# Altium footprint library Connectors.PcbLib: 158 footprints (part 10 of 10)
Each footprint in its own frame and in the unit in brackets; x right, y up, seen from the top. Pads: shape width x height; smd on the part's side, far side on the other; paste and mask are expansions set on the pad; w line width, h text height; cw(c..) or ccw(c..) is an arc to the next point about the centre after c.
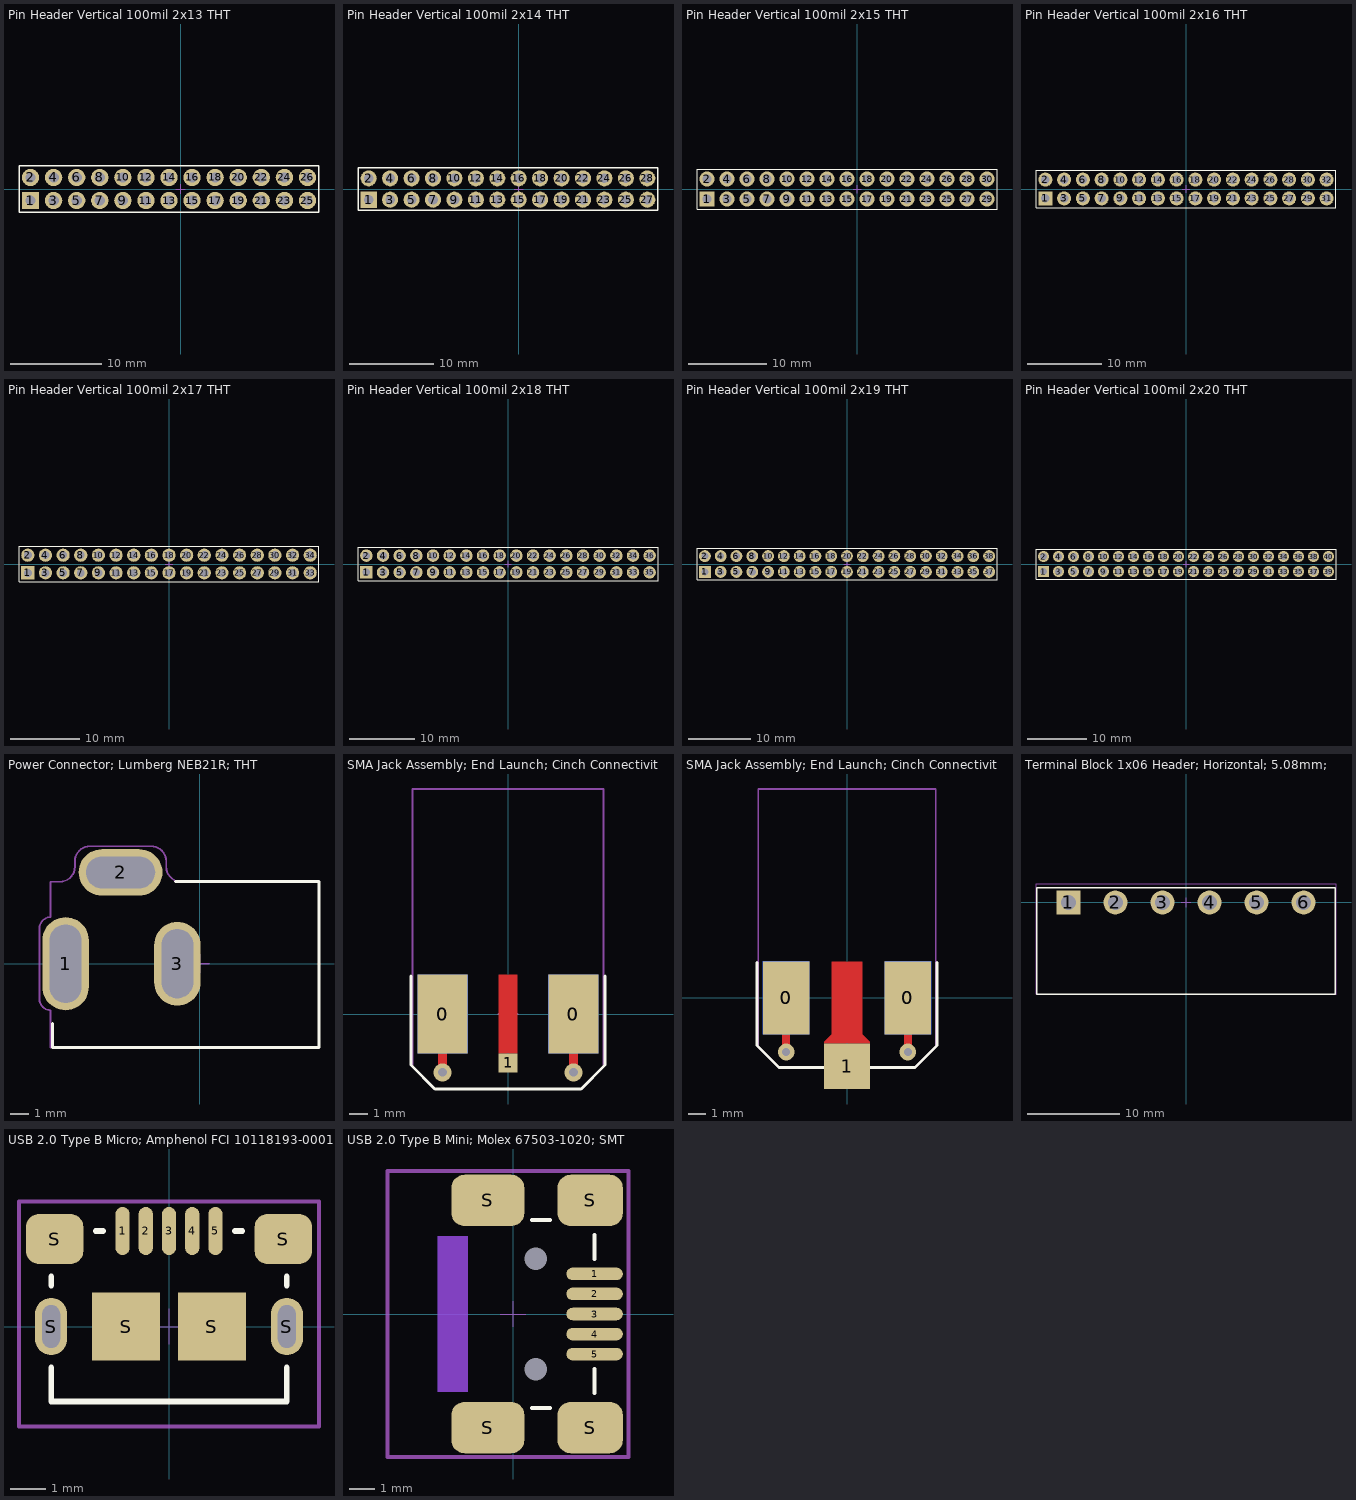
[diagram p9: the footprints below, top view; thin cyan lines are the x and y axes]

## Pin Header Vertical 100mil 2x13 THT [mil]
pads (26):
  rect 75x75 hole 45: 1(-650,-50)
  round 75 hole 45: 2(-650,50) 3(-550,-50) 4(-550,50) 5(-450,-50) 6(-450,50) 7(-350,-50) 8(-350,50) 9(-250,-50) 10(-250,50) 11(-150,-50) 12(-150,50) 13(-50,-50) 14(-50,50) 15(50,-50) 16(50,50) 17(150,-50) 18(150,50) 19(250,-50) 20(250,50) 21(350,-50) 22(350,50) 23(450,-50) 24(450,50) 25(550,-50) 26(550,50)
Top Overlay:
  lines w6: -700,-100 600,-100 600,100 -700,100 -700,-100
Mechanical 15:
  lines w4: -20,0 20,0 ; 0,-20 0,20
3D body "pin_header_vertical_100mil_2x13_THT.stp": height 337.22, standoff -117.11, extent -699.99,-99.99 600.01,100.01

## Pin Header Vertical 100mil 2x14 THT [mil]
pads (28):
  rect 75x75 hole 45: 1(-700,-50)
  round 75 hole 45: 2(-700,50) 3(-600,-50) 4(-600,50) 5(-500,-50) 6(-500,50) 7(-400,-50) 8(-400,50) 9(-300,-50) 10(-300,50) 11(-200,-50) 12(-200,50) 13(-100,-50) 14(-100,50) 15(0,-50) 16(0,50) 17(100,-50) 18(100,50) 19(200,-50) 20(200,50) 21(300,-50) 22(300,50) 23(400,-50) 24(400,50) 25(500,-50) 26(500,50) 27(600,-50) 28(600,50)
Top Overlay:
  lines w6: -750,-100 -750,100 650,100 650,-100 -750,-100
Mechanical 15:
  lines w4: -20,0 20,0 ; 0,-20 0,20
3D body "pin_header_vertical_100mil_2x14_THT.stp": height 337.22, standoff -117.11, extent -749.99,-99.99 650.01,100.01

## Pin Header Vertical 100mil 2x15 THT [mil]
pads (30):
  rect 75x75 hole 45: 1(-750,-50)
  round 75 hole 45: 2(-750,50) 3(-650,-50) 4(-650,50) 5(-550,-50) 6(-550,50) 7(-450,-50) 8(-450,50) 9(-350,-50) 10(-350,50) 11(-250,-50) 12(-250,50) 13(-150,-50) 14(-150,50) 15(-50,-50) 16(-50,50) 17(50,-50) 18(50,50) 19(150,-50) 20(150,50) 21(250,-50) 22(250,50) 23(350,-50) 24(350,50) 25(450,-50) 26(450,50) 27(550,-50) 28(550,50) 29(650,-50) 30(650,50)
Top Overlay:
  lines w6: -800,-100 -800,100 700,100 700,-100 -800,-100
Mechanical 15:
  lines w4: -20,0 20,0 ; 0,-20 0,20
3D body "pin_header_vertical_100mil_2x15_THT.stp": height 337.22, standoff -117.11, extent -799.99,-99.99 700.01,100.01

## Pin Header Vertical 100mil 2x16 THT [mil]
pads (32):
  rect 75x75 hole 45: 1(-750,-50)
  round 75 hole 45: 2(-750,50) 3(-650,-50) 4(-650,50) 5(-550,-50) 6(-550,50) 7(-450,-50) 8(-450,50) 9(-350,-50) 10(-350,50) 11(-250,-50) 12(-250,50) 13(-150,-50) 14(-150,50) 15(-50,-50) 16(-50,50) 17(50,-50) 18(50,50) 19(150,-50) 20(150,50) 21(250,-50) 22(250,50) 23(350,-50) 24(350,50) 25(450,-50) 26(450,50) 27(550,-50) 28(550,50) 29(650,-50) 30(650,50) 31(750,-50) 32(750,50)
Top Overlay:
  lines w6: -800,-100 -800,100 800,100 800,-100 -800,-100
Mechanical 15:
  lines w4: -20,0 20,0 ; 0,-20 0,20
3D body "pin_header_vertical_100mil_2x16_THT.stp": height 337.22, standoff -117.11, extent -799.99,-99.99 800.01,100.01

## Pin Header Vertical 100mil 2x17 THT [mil]
pads (34):
  rect 75x75 hole 45: 1(-800,-50)
  round 75 hole 45: 2(-800,50) 3(-700,-50) 4(-700,50) 5(-600,-50) 6(-600,50) 7(-500,-50) 8(-500,50) 9(-400,-50) 10(-400,50) 11(-300,-50) 12(-300,50) 13(-200,-50) 14(-200,50) 15(-100,-50) 16(-100,50) 17(0,-50) 18(0,50) 19(100,-50) 20(100,50) 21(200,-50) 22(200,50) 23(300,-50) 24(300,50) 25(400,-50) 26(400,50) 27(500,-50) 28(500,50) 29(600,-50) 30(600,50) 31(700,-50) 32(700,50) 33(800,-50) 34(800,50)
Top Overlay:
  lines w6: -850,-100 -850,100 850,100 850,-100 -850,-100
Mechanical 15:
  lines w4: -20,0 20,0 ; 0,-20 0,20
3D body "pin_header_vertical_100mil_2x17_THT.stp": height 337.22, standoff -117.11, extent -849.99,-99.99 850.01,100.01

## Pin Header Vertical 100mil 2x18 THT [mil]
pads (36):
  rect 75x75 hole 45: 1(-850,-50)
  round 75 hole 45: 2(-850,50) 3(-750,-50) 4(-750,50) 5(-650,-50) 6(-650,50) 7(-550,-50) 8(-550,50) 9(-450,-50) 10(-450,50) 11(-350,-50) 12(-350,50) 13(-250,-50) 14(-250,50) 15(-150,-50) 16(-150,50) 17(-50,-50) 18(-50,50) 19(50,-50) 20(50,50) 21(150,-50) 22(150,50) 23(250,-50) 24(250,50) 25(350,-50) 26(350,50) 27(450,-50) 28(450,50) 29(550,-50) 30(550,50) 31(650,-50) 32(650,50) 33(750,-50) 34(750,50) 35(850,-50) 36(850,50)
Top Overlay:
  lines w6: -900,-100 900,-100 900,100 -900,100 -900,-100
Mechanical 15:
  lines w4: -20,0 20,0 ; 0,-20 0,20
3D body "pin_header_vertical_100mil_2x18_THT.stp": height 337.22, standoff -117.11, extent -899.99,-99.99 900.01,100.01

## Pin Header Vertical 100mil 2x19 THT [mil]
pads (38):
  rect 75x75 hole 45: 1(-900,-50)
  round 75 hole 45: 2(-900,50) 3(-800,-50) 4(-800,50) 5(-700,-50) 6(-700,50) 7(-600,-50) 8(-600,50) 9(-500,-50) 10(-500,50) 11(-400,-50) 12(-400,50) 13(-300,-50) 14(-300,50) 15(-200,-50) 16(-200,50) 17(-100,-50) 18(-100,50) 19(0,-50) 20(0,50) 21(100,-50) 22(100,50) 23(200,-50) 24(200,50) 25(300,-50) 26(300,50) 27(400,-50) 28(400,50) 29(500,-50) 30(500,50) 31(600,-50) 32(600,50) 33(700,-50) 34(700,50) 35(800,-50) 36(800,50) 37(900,-50) 38(900,50)
Top Overlay:
  lines w6: -950,-100 950,-100 950,100 -950,100 -950,-100
Mechanical 15:
  lines w4: -20,0 20,0 ; 0,-20 0,20
3D body "pin_header_vertical_100mil_2x17_THT.stp": height 337.22, standoff -117.11, extent -949.99,-99.99 750.01,100.01
3D body "pin_header_vertical_100mil_2x2_THT.stp": height 337.22, standoff -117.11, extent 750.01,-99.99 950.01,100.01

## Pin Header Vertical 100mil 2x20 THT [mil]
pads (40):
  rect 75x75 hole 45: 1(-950,-50)
  round 75 hole 45: 2(-950,50) 3(-850,-50) 4(-850,50) 5(-750,-50) 6(-750,50) 7(-650,-50) 8(-650,50) 9(-550,-50) 10(-550,50) 11(-450,-50) 12(-450,50) 13(-350,-50) 14(-350,50) 15(-250,-50) 16(-250,50) 17(-150,-50) 18(-150,50) 19(-50,-50) 20(-50,50) 21(50,-50) 22(50,50) 23(150,-50) 24(150,50) 25(250,-50) 26(250,50) 27(350,-50) 28(350,50) 29(450,-50) 30(450,50) 31(550,-50) 32(550,50) 33(650,-50) 34(650,50) 35(750,-50) 36(750,50) 37(850,-50) 38(850,50) 39(950,-50) 40(950,50)
Top Overlay:
  lines w6: -1000,-100 1000,-100 1000,100 -1000,100 -1000,-100
Mechanical 15:
  lines w4: -20,0 20,0 ; 0,-20 0,20
3D body "pin_header_vertical_100mil_2x20_THT.stp": height 337.22, standoff -117.11, extent -999.99,-99.99 1000.01,100.01

## Power Connector; Lumberg NEB21R; THT [mm]
pads (3):
  oval 2.5x5 hole 1.7 slot 4.2 at 90 deg: 1(-7.2,0)
  oval 4.5x2.5 hole 1.7 slot 3.7 at 0 deg: 2(-4.25,4.9)
  oval 2.5x4.5 hole 1.7 slot 3.7 at 90 deg: 3(-1.2,0)
Top Overlay:
  lines w0.16: -7.9,-3.2 -7.9,-4.5 6.4,-4.5 6.4,4.4 -1.3,4.4
Mechanical 11:
  lines w0.1: -8.6,-1.9 ccw(c-8,-1.9) -8,-2.5 -8,-4.5 6.4,-4.5 6.4,4.4 -1,4.4 cw(c-1,5.2) -1.8,5.2 -1.8,5.5 ccw(c-2.6,5.5) -2.6,6.3 -5.9,6.3 ccw(c-5.9,5.5) -6.7,5.5 -6.7,5.2 cw(c-7.5,5.2) -7.5,4.4 -8,4.4 -8,2.5 ccw(c-8,1.9) -8.6,1.9 -8.6,-1.9
Mechanical 15:
  lines w0.1: -0.5,0 0.5,0 ; 0,-0.5 0,0.5
3D body "Lumberg - Power Socket 2.1mm 3A; NEB21R.step": height 11.05, standoff -3.45, extent -8,-4.55 6.5,5.15

## SMA Jack Assembly; End Launch; Cinch Connectivity 142-0711-821; 40mil Signal [mil] "Board thickness 1.55mm, 40mil signal trace"
pads (5):
  rect 105x165 smd: 0(-137.5,0) 0(137.5,0)
  rect 105x165 smd far side: 0(-137.5,0) 0(137.5,0)
  rect 40x40 smd paste-20: 1(0,-102.5)
via 137.5,-122.5 diameter 38 hole 18
via -137.5,-122.5 diameter 38 hole 18
Top Layer:
  rectangle: -20,-82.5 20,82.5
  lines w18: -137.5,-122.5 -137.5,0 ; 137.5,-122.5 137.5,0
Bottom Layer:
  lines w18: -137.5,-122.5 -137.5,0 ; 137.5,-122.5 137.5,0
Top Overlay:
  lines w6.3: -203.74,80 -203.74,-107.28 -153.54,-157.48 153.54,-157.48 203.74,-107.28 203.74,80
Mechanical 15:
  lines w3.94: -19.69,0 19.68,0 ; 0,-19.68 0,19.68 ; -200.79,-110.24 -200.79,472.44 200.79,472.44 200.79,-110.24 153.54,-157.48 -153.54,-157.48 -200.79,-110.24
3D body "SMA Jack Assembly End Launch 50R; 142-0701-851.step": height 161.81, standoff -150, extent -186.91,-79 187.9,465.48

## SMA Jack Assembly; End Launch; Cinch Connectivity 142-0711-821; 103mil Signal [mil] "Board thickness 1.55mm, 103mil signal trace"
pads (5):
  rect 105x165 smd: 0(-137.5,0) 0(137.5,0)
  rect 105x165 smd far side: 0(-137.5,0) 0(137.5,0)
  rect 103x103 smd paste-51.5: 1(0,-154.44)
via 137.5,-122.5 diameter 38 hole 18
via -137.5,-122.5 diameter 38 hole 18
Top Layer:
  rectangle: -35,-82.5 35,82.5
  region: 35,-82.5 51.5,-99 51.5,-103 -51.5,-103 -51.5,-99 -35,-82.5
  lines w18: -137.5,-122.5 -137.5,0 ; 137.5,-122.5 137.5,0
Bottom Layer:
  lines w18: -137.5,-122.5 -137.5,0 ; 137.5,-122.5 137.5,0
Top Overlay:
  lines w6.3: -203.74,80 -203.74,-107.28 -153.54,-157.48 153.54,-157.48 203.74,-107.28 203.74,80
Mechanical 15:
  lines w3.94: -19.69,0 19.68,0 ; 0,-19.68 0,19.68 ; -200.79,-110.24 -200.79,472.44 200.79,472.44 200.79,-110.24 153.54,-157.48 -153.54,-157.48 -200.79,-110.24
3D body "SMA Jack Assembly End Launch 50R; 142-0701-851.step": height 161.81, standoff -150, extent -186.91,-79 187.9,465.48

## Terminal Block 1x06 Header; Horizontal; 5.08mm; Amphenol FCI 20020110-H061A01LF; THT [mm]
pads (6):
  rect 2.6x2.6 hole 1.6: 1(-12.7,0)
  round 2.6 hole 1.6: 2(-7.62,0) 3(-2.54,0) 4(2.54,0) 5(7.62,0) 6(12.7,0)
Top Overlay:
  lines w0.16: -16.1,-9.9 16.1,-9.9 16.1,1.6 -16.1,1.6 -16.1,-9.9
Mechanical 11:
  lines w0.1: -16.2,-9.9 -16.2,2 16.2,2 16.2,-9.9 -16.2,-9.9
Mechanical 15:
  lines w0.1: -0.5,0 0.5,0 ; 0,-0.5 0,0.5
3D body "Terminal Block 1x06 Header; Horizontal; 5.08mm; Amphenol FCI 20020110-H061A01LF; THT.stp": height 8.55, standoff -3.45, extent -16.24,-9.988 16.24,2.012

## USB 2.0 Type B Micro; Amphenol FCI 10118193-0001LF; SMT [mm]
pads (11):
  oval 0.4x1.35 smd: 1(-1.3,2.675) 2(-0.65,2.675) 3(0,2.675) 4(0.65,2.675) 5(1.3,2.675)
  oval 0.9x1.6 hole 0.5 slot 1.2 at 90 deg: S(-3.3,0) S(3.3,0)
  rrect50% 1.6x1.4 smd: S(-3.2,2.45) S(3.2,2.45)
  rect 1.9x1.9 smd: S(-1.2,0) S(1.2,0)
Top Overlay:
  lines w0.16: -3.3,-1.15 -3.3,-2.1 3.3,-2.1 3.3,-1.15 ; -3.3,1.15 -3.3,1.4 ; -2.05,2.675 -1.85,2.675 ; 1.85,2.675 2.05,2.675 ; 3.3,1.15 3.3,1.4
Mechanical 15:
  lines w0: -0.5,0 0.5,0 ; 0,-0.5 0,0.5
  lines w0.1: -4.2,-2.8 -4.2,3.5 4.2,3.5 4.2,-2.8 -4.2,-2.8
3D body "USB 2.0 Type B Micro; Amphenol FCI 10118193-0001LF; SMT.step": height 2.83, standoff -0.77, extent -3.928,-2.775 3.929,2.885

## USB 2.0 Type B Mini; Molex 67503-1020; SMT [mm]
pads (11):
  oval 2.25x0.5 smd: 1(3.25,1.6) 2(3.25,0.8) 3(3.25,0) 4(3.25,-0.8) 5(3.25,-1.6)
  rrect50% 2.9x2.05 smd: S(-1,-4.525) S(-1,4.525)
  rrect50% 2.6x2.05 smd: S(3.075,-4.525) S(3.075,4.525)
  round 0.85 hole 0.9 unplated mask+0: ""(0.9,-2.2) ""(0.9,2.2)
Top Layer keep-out:
  region: -3,3.1 -1.8,3.1 -1.8,-3.1 -3,-3.1
Bottom Layer keep-out:
  region: -1.8,3.1 -3,3.1 -3,-3.1 -1.8,-3.1
Top Overlay:
  lines w0.16: 0.75,-3.75 1.475,-3.75 ; 0.75,3.75 1.475,3.75 ; 3.25,-3.15 3.25,-2.2 ; 3.25,2.2 3.25,3.15
Mechanical 15:
  lines w0: -0.5,0 0.5,0 ; 0,-0.5 0,0.5
  lines w0.16: -5,-5.7 4.6,-5.7 4.6,5.7 -5,5.7 -5,-5.7
3D body "675031020.stp": height 3.96, standoff -0.99, extent -5.01,-4.95 3.99,4.95